# Altium footprint library DPIAT_202303.PcbLib: 77 footprints (part 2 of 5)
Each footprint in its own frame and in the unit in brackets; x right, y up, seen from the top. Pads: shape width x height; smd on the part's side, far side on the other; paste and mask are expansions set on the pad; w line width, h text height; cw(c..) or ccw(c..) is an arc to the next point about the centre after c.
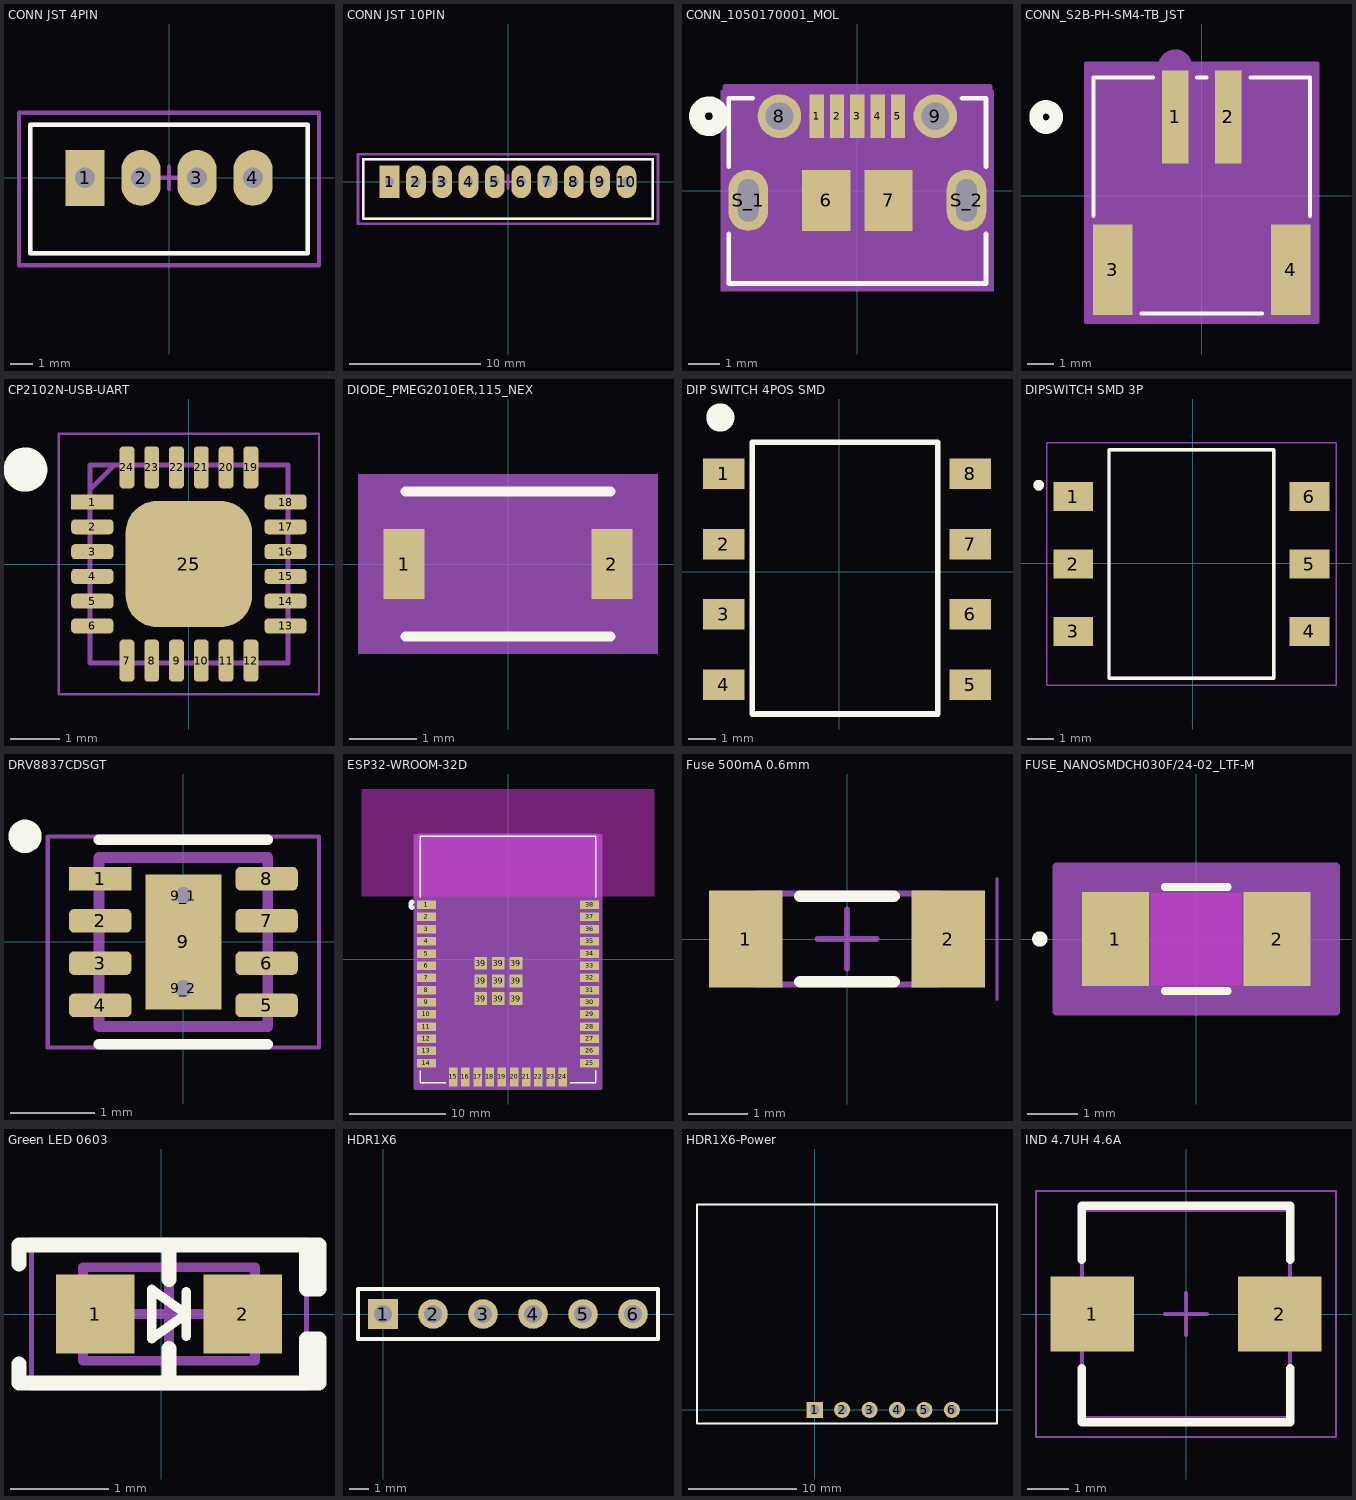
[diagram p1: the footprints below, top view; thin cyan lines are the x and y axes]

## CONN JST 4PIN [mm] "Conn 4 pin JST"
pads (4):
  rect 1.75x2.5 hole 0.9: 1(-3.75,0)
  oval 1.75x2.5 hole 0.9: 2(-1.25,0) 3(1.25,0) 4(3.75,0)
Top Overlay:
  lines w0.2: -6.2,-3.375 6.2,-3.375 6.2,2.375 -6.2,2.375 -6.2,-3.375
Mechanical 1:
  lines w0.2: -6.2,-3.375 -6.2,2.375 6.2,2.375 6.2,-3.375 -6.2,-3.375
Mechanical 15:
  lines w0.2: -0.5,0 0.5,0 ; 0,-0.5 0,0.5 ; -6.7,-3.9 6.7,-3.9 6.7,2.9 -6.7,2.9 -6.7,-3.9
3D body "JST B4B-XH-A.STEP": height 7, standoff -3.4, extent -6.2,-3.375 6.2,2.375

## CONN JST 10PIN [mm]
pads (10):
  rect 1.5x2.5 hole 0.7: 1(-9,0)
  oval 1.5x2.5 hole 0.7: 2(-7,0) 3(-5,0) 4(-3,0) 5(-1,0) 6(1,0) 7(3,0) 8(5,0) 9(7,0) 10(9,0)
Top Overlay:
  lines w0.2: -11,-2.8 -11,1.7 11,1.7 11,-2.8 -11,-2.8
Bottom Overlay:
  circle w0.254: c-10.1,1.1 r0.141
Mechanical 13:
  lines w0.2: 10.95,-2.8 -11,-2.8 -11,1.7 11,1.7 11,-2.8
Mechanical 15:
  lines w0.2: -0.5,0 0.5,0 ; 0,-0.5 0,0.5 ; -11.4,-3.2 11.4,-3.2 11.4,2.1 -11.4,2.1 -11.4,-3.2
3D body "JST B10B-PH-K-S.STEP": height 6, standoff -3.4, extent -10.95,-2.8 10.95,1.7

## CONN_1050170001_MOL [mil]
pads (11):
  rect 18x55 smd paste+0 mask+0: 1(-51.18,94.28) 2(-25.59,94.28) 3(0,94.28) 4(25.59,94.28) 5(51.18,94.28)
  rect 61x77 smd: 6(-39.37,-12.02) 7(39.37,-12.02)
  round 55 hole 35 mask+0: 8(-98.43,94.28) 9(98.43,94.28)
  oval 50x77 hole 26 slot 54 at 90 deg mask+0: S_1(-137.8,-12.02) S_2(137.8,-12.02)
Top Overlay:
  circle w20: c-187.5,94.28 r15
  lines w6: -162.5,-54.52 -162.5,-117 162.5,-117 162.5,-54.52 ; -162.5,30.49 -162.5,117 -132.08,117 ; 132.08,117 162.5,117 162.5,30.49
Bottom Overlay:
  circle w20: c-187.5,94.28 r15
Mechanical 5:
  region: -172.5,127 172.5,127 172.5,-127 -172.5,-127
Mechanical 13:
  circle w20: c-51.18,19.28 r15
  lines w1: -157.5,-112 -157.5,112 157.5,112 157.5,-112 -157.5,-112
Mechanical 15:
  region: 167.5,131.78 -167.5,131.78 -167.5,-122 167.5,-122
  lines w6: -167.5,-122 167.5,-122 167.5,131.78 -167.5,131.78 -167.5,-122
Multi-Layer:
  lines w26: -137.8,-25.52 -137.8,1.48 ; 137.8,-25.52 137.8,1.48
3D body: height 10, standoff 0, extent 0,0 10,10

## CONN_S2B-PH-SM4-TB_JST [mil]
pads (4):
  rect 39x138 smd paste+0 mask+0: 1(-39.37,116.35) 2(39.37,116.35)
  rect 59x134 smd: 3(-131.89,-110.03) 4(131.89,-110.03)
Top Overlay:
  circle w20: c-230.5,116.35 r15
  lines w6: -160.5,-29.93 -160.5,174.5 -71.97,174.5 ; -89.29,-174.5 89.29,-174.5 ; -6.77,174.5 6.77,174.5 ; 71.97,174.5 160.5,174.5 160.5,-29.93
Bottom Overlay:
  circle w20: c-230.5,116.35 r15
Mechanical 5:
  region: -170.5,184.5 170.5,184.5 170.5,-184.5 -170.5,-184.5
Mechanical 13:
  circle w20: c-39.37,191.35 r15
  lines w1: -155.5,-169.5 -155.5,169.5 155.5,169.5 155.5,-169.5 -155.5,-169.5
Mechanical 15:
  region: 171.39,195.35 -171.39,195.35 -171.39,-187.03 171.39,-187.03
  lines w6: -171.39,-187.03 171.39,-187.03 171.39,195.35 -171.39,195.35 -171.39,-187.03
3D body: height 10, standoff 0, extent 0,0 10,10

## CP2102N-USB-UART [mm] "USB TO UART"
pads (25):
  rect 0.85x0.3 smd: 1(-1.95,1.25)
  rrect50% 0.85x0.3 smd: 2(-1.95,0.75) 3(-1.95,0.25) 4(-1.95,-0.25) 5(-1.95,-0.75) 6(-1.95,-1.25) 13(1.95,-1.25) 14(1.95,-0.75) 15(1.95,-0.25) 16(1.95,0.25) 17(1.95,0.75) 18(1.95,1.25)
  rrect50% 0.3x0.85 smd: 7(-1.25,-1.95) 8(-0.75,-1.95) 9(-0.25,-1.95) 10(0.25,-1.95) 11(0.75,-1.95) 12(1.25,-1.95) 19(1.25,1.95) 20(0.75,1.95) 21(0.25,1.95) 22(-0.25,1.95) 23(-0.75,1.95) 24(-1.25,1.95)
  rrect50% 2.55x2.55 smd: 25(0,0)
Top Overlay:
  circle w0.635: c-3.302,1.905 r0.127
Mechanical 13:
  lines w0.05: -2.625,-2.625 2.625,-2.625 2.625,2.625 -2.625,2.625 -2.625,-2.625
  lines w0.1: -2,1.5 -1.5,2 ; -2,-2 2,-2 2,2 -2,2 -2,-2
3D body "CP2102N-A02-GQFN24.STEP": height 0.8, standoff 0, extent -2,-2 2,2

## DIODE_PMEG2010ER,115_NEX [mil]
pads (2):
  rect 24x41 smd paste+0 mask+0: 1(-60.83,0) 2(60.83,0)
Top Overlay:
  lines w6: -60,-42.5 60,-42.5 ; -60,42.5 60,42.5
Mechanical 5:
  region: 87.83,-52.5 -87.83,-52.5 -87.83,52.5 87.83,52.5
Mechanical 13:
  lines w1: -55,-37.5 55,-37.5 55,37.5 -55,37.5 -55,-37.5
Mechanical 15:
  region: -65,-30.5 -82.83,-30.5 -82.83,30.5 -65,30.5 -65,47.5 65,47.5 65,30.5 82.83,30.5 82.83,-30.5 65,-30.5 65,-47.5 -65,-47.5
  lines w6: -82.83,-30.5 -82.83,30.5 -65,30.5 -65,47.5 65,47.5 65,30.5 82.83,30.5 82.83,-30.5 65,-30.5 65,-47.5 -65,-47.5 -65,-30.5 -82.83,-30.5
3D body: height 10, standoff 0, extent 0,0 10,10

## DIP SWITCH 4POS SMD [mm] "DIP switch 4position surface mount"
pads (8):
  rect 1.5x1.1 smd: 1(-4.17,3.535) 2(-4.17,0.995) 3(-4.17,-1.545) 4(-4.17,-4.085) 5(4.73,-4.085) 6(4.73,-1.545) 7(4.73,0.995) 8(4.73,3.535)
Top Overlay:
  circle w0.762: c-4.297,5.567 r0.127
  lines w0.2: -3.14,4.605 -3.14,-5.145 3.56,-5.145 3.56,-5.065 3.56,4.665 -1.69,4.665 -3.14,4.665
3D body "CUI_DEVICES_DS04-254-2-04BK-SMT-TR.step": height 3.99, standoff -0.01, extent -4.802,-5.863 5.098,5.297

## DIPSWITCH SMD 3P [mm] "Dip switch surface mount 3 positions"
pads (6):
  rect 1.5x1.1 smd: 1(-4.5,2.515) 2(-4.5,-0.025) 3(-4.5,-2.565) 4(4.4,-2.565) 5(4.4,-0.025) 6(4.4,2.515)
Top Overlay:
  circle w0.2: c-5.8,2.945 r0.1
  lines w0.127: -3.15,-4.335 -3.15,4.285 3.05,4.285 3.05,-4.335 -3.15,-4.335
Mechanical 13:
  circle w0.2: c-5.8,2.945 r0.1
  lines w0.127: -3.15,-4.335 -3.15,4.285 3.05,4.285 3.05,-4.335 -3.15,-4.335
Mechanical 15:
  lines w0.05: -5.5,-4.585 5.4,-4.585 5.4,4.535 -5.5,4.535 -5.5,-4.585
3D body "A6S-3101-H--3DModel-STEP-273799.STEP": height 3.7, standoff 0, extent -4.95,-4.305 4.85,4.255

## DRV8837CDSGT [mm] "Drive moteur low-mid current"
pads (11):
  rect 0.74x0.28 smd: 1(-0.985,0.75)
  rrect45% 0.74x0.28 smd: 2(-0.985,0.25) 3(-0.985,-0.25) 4(-0.985,-0.75) 5(0.985,-0.75) 6(0.985,-0.25) 7(0.985,0.25) 8(0.985,0.75)
  rect 0.9x1.6 smd paste-2: 9(0,0)
  round 0.4 hole 0.2 mask+0: 9_1(0,0.55) 9_2(0,-0.55)
Top Overlay:
  circle w0.254: c-1.875,1.25 r0.071
  lines w0.127: -1,-1.21 1,-1.21 ; -1,1.21 1,1.21
Top Paste:
  region: 0.28,-0.51 -0.28,-0.51 -0.28,0.51 0.28,0.51
Mechanical 13:
  lines w0.127: -1,-1 -1,1 1,1 1,-1 -1,-1
Mechanical 15:
  lines w0.05: -1.605,-1.25 -1.605,1.25 1.605,1.25 1.605,-1.25 -1.605,-1.25
3D body "step_temp.STEP": height 0.8, standoff 0, extent -1,-1 1,1

## ESP32-WROOM-32D [mil] "ESP32-WROOM-32D"
pads (47):
  rect 79x35 smd paste+0 mask+0: 1(-334.65,224.56) 2(-334.65,174.56) 3(-334.65,124.56) 4(-334.65,74.56) 5(-334.65,24.55) 6(-334.65,-25.45) 7(-334.65,-75.44) 8(-334.65,-125.44) 9(-334.65,-175.44) 10(-334.65,-225.44) 11(-334.65,-275.44) 12(-334.65,-325.44) 13(-334.65,-375.44) 14(-334.65,-425.44) 25(334.65,-425.44) 26(334.65,-375.44) 27(334.65,-325.44) 28(334.65,-275.44) 29(334.65,-225.44) 30(334.65,-175.44) 31(334.65,-125.44) 32(334.65,-75.44) 33(334.65,-25.45) 34(334.65,24.55) 35(334.65,74.56) 36(334.65,124.56) 37(334.65,174.56) 38(334.65,224.56)
  rect 35x79 smd: 15(-225,-482.19) 16(-175,-482.19) 17(-125,-482.19) 18(-75,-482.19) 19(-25,-482.19) 20(25,-482.19) 21(75,-482.19) 22(125,-482.19) 23(175,-482.19) 24(225,-482.19)
  rect 52x52 smd: 39(-111.78,-160.44) 39(-111.78,-88.2) 39(-111.78,-15.96) 39(-39.54,-160.44) 39(-39.54,-88.2) 39(-39.54,-15.96) 39(32.71,-160.44) 39(32.71,-88.2) 39(32.71,-15.96)
Top Overlay:
  lines w6: -359.5,-456.05 -359.5,-507 -255.6,-507 ; -359.5,255.16 -359.5,507 359.5,507 359.5,255.16 ; 255.6,-507 359.5,-507 359.5,-456.05
  lines w20: -394.25,213.15 cw(c-384.5,224.56) -394.25,235.96
Bottom Overlay:
  circle w20: c-384.5,224.56 r15
Keep-Out Layer:
  region: -600,700 600,700 600,260 -600,260
Mechanical 5:
  region: -369.5,517 369.5,517 369.5,-517 -369.5,-517
Mechanical 13:
  circle w20: c-334.65,299.56 r15
  lines w1: -354.5,-502 354.5,-502 354.5,502 -354.5,502 -354.5,-502
Mechanical 15:
  region: 384.15,512 -384.15,512 -384.15,-531.68 384.15,-531.68
  lines w6: -384.15,-531.68 -384.15,512 384.15,512 384.15,-531.68 -384.15,-531.68
3D body "ESP32-WROOM-32D--3DModel-STEP-56544.STEP": height 127.95, standoff 0, extent -354.33,-481.97 354.33,521.97
3D body: height 10, standoff 0, extent 0,0 10,10

## Fuse 500mA 0.6mm [mm]
pads (2):
  rect 1.25x1.65 smd: 1(-1.725,0) 2(1.725,0)
Top Overlay:
  lines w0.2: -0.8,-0.725 0.8,-0.725 ; -0.8,0.725 0.8,0.725
Mechanical 13:
  lines w0.1: -1.55,-0.775 1.55,-0.775 1.55,0.775 -1.55,0.775 -1.55,-0.775
Mechanical 15:
  lines w0.05: 2.55,-1.025 2.55,1.025
  lines w0.1: -0.5,0 0.5,0 ; 0,-0.5 0,0.5
3D body "FUSE 1206_3216 0.6MM.step": height 0.76, standoff 0, extent -1.55,-0.775 1.55,0.775

## FUSE_NANOSMDCH030F/24-02_LTF-M [mil]
pads (2):
  rect 52x73 smd paste+0 mask+0: 1(-63,0) 2(63,0)
Top Layer keep-out:
  region: -35,-33.5 -35,33.5 35,33.5 35,-33.5
Top Overlay:
  circle w6: c-122,0 r3
  lines w6: -24.53,-40.5 24.53,-40.5 ; -24.53,40.5 24.53,40.5
Keep-Out Layer:
  region: -35,-35.5 -35,35.5 35,35.5 35,-35.5
Mechanical 13:
  circle w0: c-58,0 r3
  lines w1: -67,-35.5 -67,35.5 ; -67,-35.5 -37,-35.5 -37,35.5 -67,35.5 ; -67,-35.5 67,-35.5 ; -67,-35.5 -67,35.5 ; -67,35.5 67,35.5 ; 67,-35.5 37,-35.5 37,35.5 67,35.5 ; 67,-35.5 67,35.5 ; 67,-35.5 67,35.5
Mechanical 15:
  region: 109,-56.5 -109,-56.5 -109,56.5 109,56.5
  lines w6: -109,-56.5 -109,56.5 109,56.5 109,-56.5 -109,-56.5
3D body: height 10, standoff 0, extent 0,0 10,10

## Green LED 0603 [mm] "Green led SMD"
pads (2):
  rect 0.8x0.8 smd: 1(-0.671,0) 2(0.829,0)
Top Overlay:
  lines w0.1: 0.254,-0.225 0.254,0 ; 0.254,0.225 0.254,0 ; 0.254,0 -0.096,-0.25 -0.096,0 -0.096,0.25 0.254,0
  lines w0.15: -1.445,-0.508 -1.445,-0.7 1.579,-0.7 ; -1.445,0.508 -1.445,0.7 1.579,0.7 ; 0.079,-0.7 0.079,-0.35 ; 0.079,0.35 0.079,0.7 ; 1.476,-0.7 1.603,-0.7 1.603,-0.254 1.476,-0.254 1.476,-0.7 ; 1.476,0.254 1.603,0.254 1.603,0.7 1.476,0.7 1.476,0.254
Mechanical 13:
  lines w0.1: -0.796,-0.475 -0.796,0.475 0.954,0.475 0.954,-0.475 -0.796,-0.475
Mechanical 15:
  lines w0.05: -1.318,-0.75 -1.318,0.75 1.476,0.75 1.476,-0.75 -1.318,-0.75
  lines w0.1: -0.396,0 0.554,0 ; 0.079,-0.475 0.079,0.475
3D body "LED 0603 Lens GREEN.STEP": height 0.53, standoff 0.18, extent -0.471,-0.4 0.629,0.4
3D body "LED 0603 Base GREEN.STEP": height 0.28, standoff 0, extent -0.721,-0.4 0.879,0.4

## HDR1X6 [mm] "Connector; Header; 6 Position"
pads (6):
  rect 1.5x1.5 hole 0.9: 1(0,0)
  round 1.5 hole 0.9: 2(2.54,0) 3(5.08,0) 4(7.62,0) 5(10.16,0) 6(12.7,0)
Top Overlay:
  lines w0.2: -1.27,-1.27 13.97,-1.27 13.97,1.27 -1.27,1.27 -1.27,-1.27

## HDR1X6-Power [mm] "Connector; Header; 6 Position"
pads (6):
  rect 1.5x1.5 hole 0.9: 1(0,0)
  round 1.5 hole 0.9: 2(2.54,0) 3(5.08,0) 4(7.62,0) 5(10.16,0) 6(12.7,0)
Top Overlay:
  lines w0.2: -10.922,-1.27 16.891,-1.27 16.891,19.05 -10.922,19.05 -10.922,-1.27

## IND 4.7UH 4.6A [mm]
pads (2):
  rect 2x1.8 smd: 1(-2.25,0) 2(2.25,0)
Top Overlay:
  lines w0.2: -2.5,-1.3 -2.5,-2.6 2.5,-2.6 2.5,-1.3 ; -2.5,1.3 -2.5,2.6 2.5,2.6 2.5,1.3
Mechanical 13:
  lines w0.1: -2.5,-2.5 -2.5,2.5 2.5,2.5 2.5,-2.5 -2.5,-2.5
Mechanical 15:
  lines w0.05: -3.6,-2.95 -3.6,2.95 3.6,2.95 3.6,-2.95 -3.6,-2.95
  lines w0.1: -0.5,0 0.5,0 ; 0,-0.5 0,0.5
3D body "Bourns SRP5030T.STEP": height 3, standoff 0, extent -2.85,-2.6 2.85,2.6